# Altium footprint library MH_DA_THU_VIEN_16122016.PcbLib: 531 footprints (part 30 of 34)
Each footprint in its own frame and in the unit in brackets; x right, y up, seen from the top. Pads: shape width x height; smd on the part's side, far side on the other; paste and mask are expansions set on the pad; w line width, h text height; cw(c..) or ccw(c..) is an arc to the next point about the centre after c.
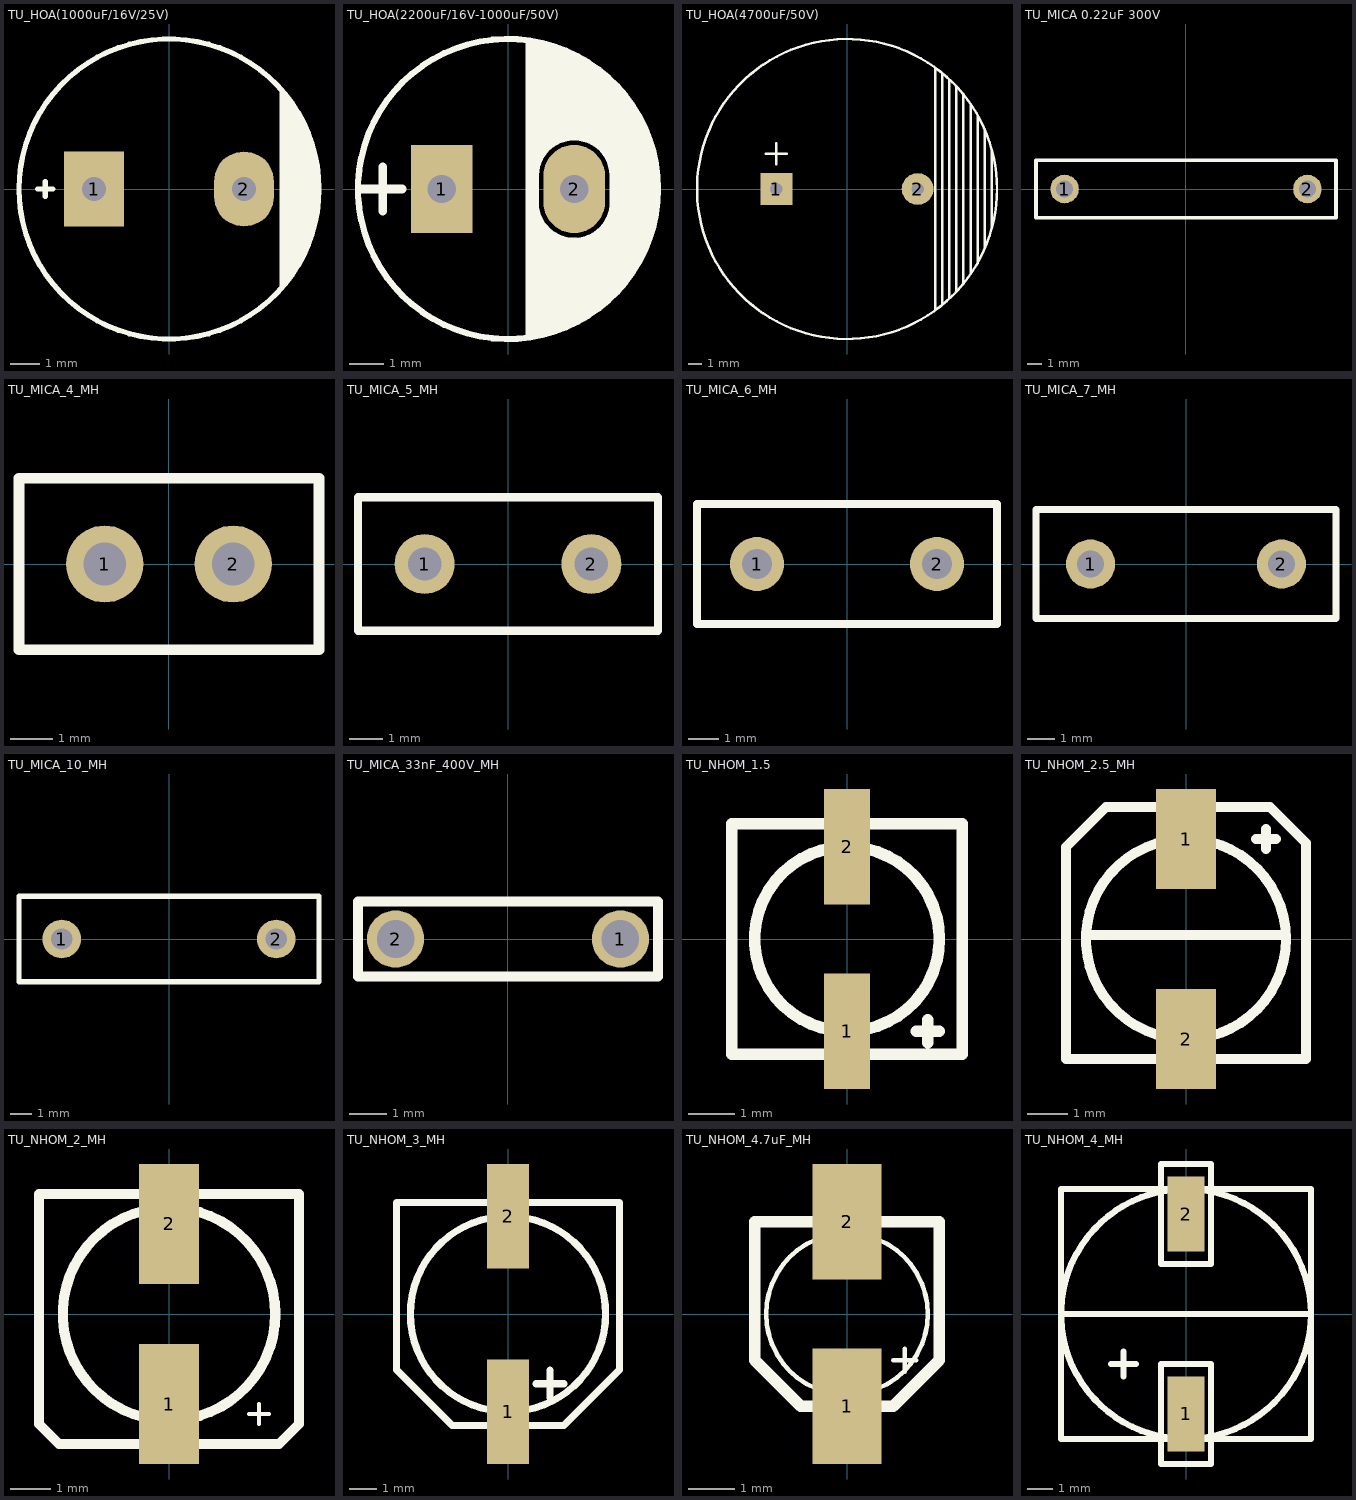
[diagram p29: the footprints below, top view; thin cyan lines are the x and y axes]

## TU_HOA(1000uF/16V/25V) [mil] "Tu hoa 1000uF/16V/25V"
pads (2):
  rect 80x100 hole 32: 1(-100,0)
  oval 80x100 hole 32: 2(100,0)
Top Overlay:
  circle w7: c0,0 r200
  region: 148,133 148,-134 162,-117 174,-97 184,-81 193,-55 199,-21 198,21 196,46 181,85 158,122
  lines w7: -175,0 -155,0 ; -165,-10 -165,10

## TU_HOA(2200uF/16V-1000uF/50V) [mil]
height 300
pads (2):
  rect 70x100 hole 32: 1(-75,0)
  oval 70x100 hole 32: 2(75,0)
Top Overlay:
  circle w7: c0,0 r170
  region: 25,25 60,60 87.93,60.33 94.59,59.01 100.24,55.24 100,55 106.63,48.7 109.3,44.71 110.24,40 110,40 115.24,35.24 119.01,29.59 120.33,22.93 120,22.93 120.33,-27.93 119.01,-34.59 115.24,-40.24 115,-40 103.7,-51.63 99.71,-54.3 95,-55.24 95.24,-55.24 89.59,-59.01 82.93,-60.33 82.93,-60 69.14,-60.29 60.23,-59.12 51.92,-55.68 44.79,-50.21 45,-50 33.37,-38.7 30.7,-34.71 29.76,-30 30,-30 25,-30 25,-170 80,-150 120,-120 150,-80 170,-20 170,20 155,70 125,115 90,145 45,165 25,170
  lines w10: -165,0 -120,0 ; -142,-25 -142,25 ; 25,-165 25,165 ; 25,25 30,25 ; 30,-20 30,30 ; 30,-10 ccw(c75,-15) 70,-60 ccw(c75,-15) 120,-20 120,15 ccw(c75,15) 75,60 ccw(c75,15) 30,15
3D body: height 445.89, standoff -754.41, extent -159.96,-157.48 155,157.48

## TU_HOA(4700uF/50V) [mil] "Tu hoa 4700uF/50V"
height 600
pads (2):
  rect 90x90 hole 35: 1(-200,0)
  round 90 hole 35: 2(200,0)
Top Overlay:
  circle w7: c0,0 r425
  lines w7: -230,100 -170,100 ; -200,70 -200,130 ; 250,-340 250,340 ; 270,-325 270,325 ; 290,-310 290,310 ; 310,-290 310,290 ; 330,-265 330,265 ; 350,-240 350,240 ; 370,-210 370,205 ; 390,-165 390,170
  lines w8: 410,-110 410,110
3D body: height 984.25, standoff 0, extent -436.14,-438.07 430,428.07

## TU_MICA 0.22uF 300V [mm]
pads (2):
  round 2 hole 1.2: 1(-8.5,0) 2(8.5,0)
Top Overlay:
  lines w0.254: -10.5,-2 -10.5,2 10.5,2 10.5,-2 -10.5,-2

## TU_MICA_4_MH [mm]
pads (2):
  round 1.8 hole 1: 1(-1.5,0) 2(1.5,0)
Top Overlay:
  lines w0.254: -3.5,-2 -3.5,2 3.5,2 3.5,-2 -3.5,-2
3D body: height 10, standoff 3, extent -3,-2 3,2

## TU_MICA_5_MH [mm]
pads (2):
  round 1.8 hole 1: 1(-2.5,0) 2(2.5,0)
Top Overlay:
  lines w0.254: -4.5,-2 -4.5,2 4.5,2 4.5,-2 -4.5,-2
3D body: height 10, standoff 3, extent -3,-2 3,2

## TU_MICA_6_MH [mm]
pads (2):
  round 1.8 hole 1: 1(-3,0) 2(3,0)
Top Overlay:
  lines w0.254: -5,-2 -5,2 5,2 5,-2 -5,-2
3D body: height 6, standoff 3, extent -5,-2 5,2

## TU_MICA_7_MH [mm]
pads (2):
  round 1.8 hole 1: 1(-3.5,0) 2(3.5,0)
Top Overlay:
  lines w0.254: -5.5,-2 5.5,-2 5.5,2 -5.5,2 -5.5,-2
3D body: height 10, standoff 3, extent -5.5,-2 5.5,2

## TU_MICA_10_MH [mm]
pads (2):
  round 1.8 hole 1: 1(-5,0) 2(5,0)
Top Overlay:
  lines w0.254: -7,-2 -7,2 7,2 7,-2 -7,-2
3D body: height 8, standoff 3, extent -6,-2 6,2

## TU_MICA_33nF_400V_MH [mm]
pads (2):
  round 1.524 hole 1: 1(3,0) 2(-3,0)
Top Overlay:
  lines w0.254: -4,-1 -4,1 4,1 4,-1 -4,-1

## TU_NHOM_1.5 [mm]
pads (2):
  rect 1x2.5 smd: 1(0,-2) 2(0,2)
Top Overlay:
  circle w0.254: c0,0 r2
  lines w0.254: 1.5,-2 2,-2 ; 1.75,-2.25 1.75,-1.75 ; -2.5,-2.5 2.5,-2.5 2.5,2.5 -2,2.5 -2.5,2.5 -2.5,-2.5
3D body: height 5.55, standoff 0, extent -2.648,-3 2.648,3

## TU_NHOM_2.5_MH [mm]
pads (2):
  rect 1.5x2.5 smd: 1(0,2.5) 2(0,-2.5)
Top Overlay:
  circle w0.254: c0,0 r2.5
  lines w0.254: -2.8,2.5 -2,3.3 ; -2.4,0.1 2.4,0.1 ; -1.8,3.3 -2,3.3 ; 1.75,2.5 2.25,2.5 ; 1.9,3.3 2.1,3.3 ; 2,2.25 2,2.75 ; 2.9,2.5 2.1,3.3 ; -2,3.3 2.1,3.3 ; -2,3.3 -3,2.3 -3,-3 3,-3 3,2.4 2.1,3.3
3D body: height 8.11, standoff 0, extent -3.3,-3.5 3.3,3.5

## TU_NHOM_2_MH [mm]
pads (2):
  rect 1.5x3 smd: 1(0,-2.25) 2(0,2.25)
Top Overlay:
  circle w0.254: c0,0 r2.658
  lines w0.1: 2,-2.5 2.5,-2.5 ; 2.25,-2.75 2.25,-2.5 2.25,-2.25
  lines w0.254: -3.25,-2.75 -3.25,3 3.25,3 3.25,-2.75 2.75,-3.25 -2.75,-3.25 -3.25,-2.75

## TU_NHOM_3_MH [mm]
pads (2):
  rect 1.5x3.75 smd: 1(0,-3.5) 2(0,3.5)
Top Overlay:
  circle w0.254: c0,0 r3.5
  lines w0.254: 1,-2.5 2,-2.5 ; 1.5,-3 1.5,-2 ; 2,-4 -2,-4 -4,-2 -4,4 4,4 4,-2 2,-4 ; 2,-4 2,-4
3D body: height 11.23, standoff -0.2, extent -4.15,-5 4.15,4

## TU_NHOM_4.7uF_MH [mm]
pads (2):
  rect 1.5x2.5 smd: 1(0,-2) 2(0,2)
Top Overlay:
  circle w0.1: c0,0 r1.75
  lines w0.1: 1,-1 1.5,-1 ; 1.25,-1.25 1.25,-1 1.25,-0.75
  lines w0.254: -2,-1 -1,-2 1,-2 2,-1 2,2 -2,2 -2,-1
3D body: height 5.4, standoff -0.05, extent -2.15,-2.5 2.15,2.5

## TU_NHOM_4_MH [mm] "TU_NHOM_4"
pads (2):
  rect 1.5x3 smd: 1(0,-4) 2(0,4)
Top Overlay:
  circle w0.254: c0,0 r5
  lines w0.254: -3,-2 -2,-2 ; -2.5,-2.5 -2.5,-1.5 ; 5,0 -5,0 ; -5,0 -5,-5 5,-5 5,5 -5,5 -5,0 ; -1,-6 1,-6 1,-2 -1,-2 -1,-6 ; -1,2 -1,6 1,6 1,2 -1,2
3D body: height 7.31, standoff -0.4, extent -4,-3.905 4.3,5.295